# Altium footprint library Molex FFC - FPC Connectors (SMT).PcbLib: 638 footprints (part 36 of 40)
Each footprint in its own frame and in the unit in brackets; x right, y up, seen from the top. Pads: shape width x height; smd on the part's side, far side on the other; paste and mask are expansions set on the pad; w line width, h text height; cw(c..) or ccw(c..) is an arc to the next point about the centre after c.
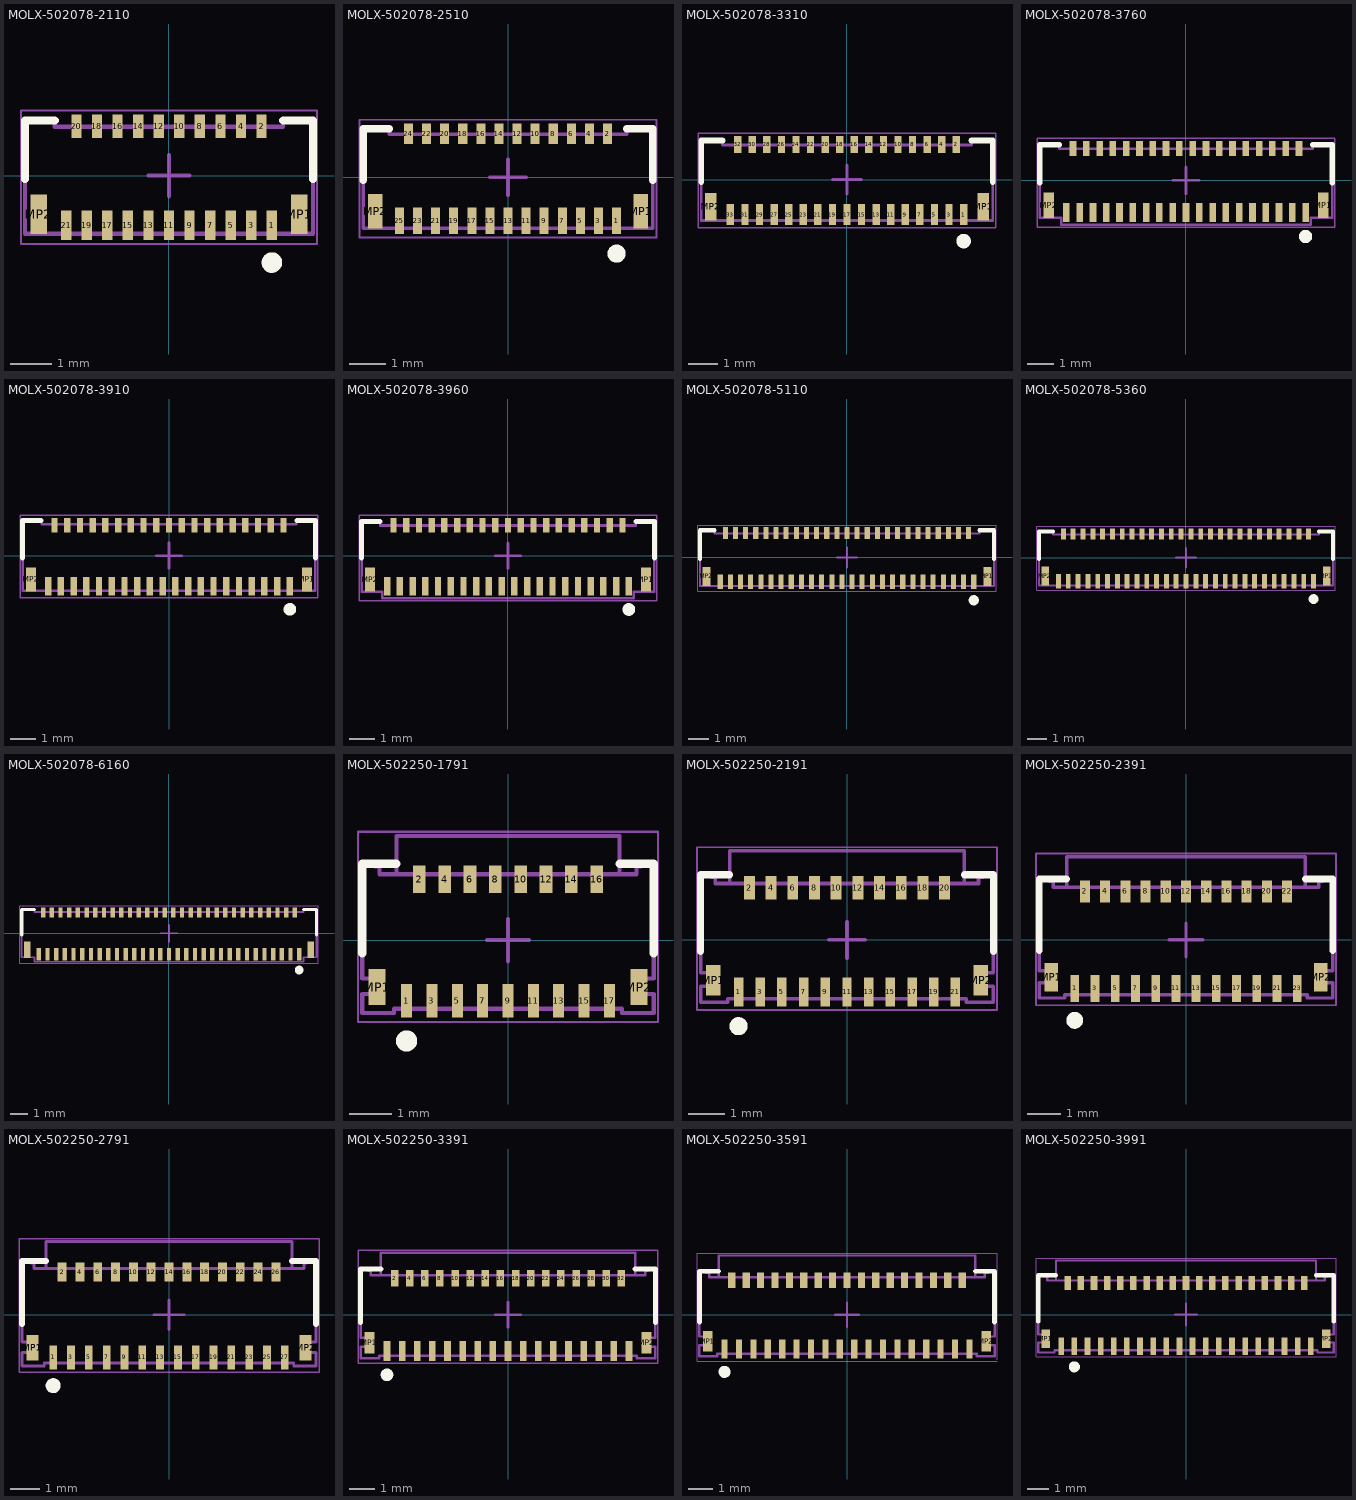
[diagram p35: the footprints below, top view; thin cyan lines are the x and y axes]

## MOLX-502078-2110 [mm] "FPC Connector, 21-Leads, Right Angle, Pitch 0.25 mm, Mated Height 1.0 mm, SMT"
height 1.012
pads (23):
  rect 0.25x0.72 smd: 1(2.5,-1.202) 3(2,-1.202) 5(1.5,-1.202) 7(1,-1.202) 9(0.5,-1.202) 11(0,-1.202) 13(-0.5,-1.202) 15(-1,-1.202) 17(-1.5,-1.202) 19(-2,-1.202) 21(-2.5,-1.202)
  rect 0.25x0.57 smd: 2(2.25,1.202) 4(1.75,1.202) 6(1.25,1.202) 8(0.75,1.202) 10(0.25,1.202) 12(-0.25,1.202) 14(-0.75,1.202) 16(-1.25,1.202) 18(-1.75,1.202) 20(-2.25,1.202)
  rect 0.4x0.95 smd: MP1(3.17,-0.937) MP2(-3.17,-0.937)
Top Overlay:
  circle w0.25: c2.5,-2.112 r0.125
  lines w0.2: -3.5,-0.084 -3.5,1.338 -2.775,1.338 ; 2.775,1.338 3.5,1.338 3.5,-0.084
Mechanical 13:
  lines w0.1: -3.5,-1.412 -3.5,1.338 -2.775,1.338 -2.775,1.188 2.775,1.188 2.775,1.338 3.5,1.338 3.5,-1.412 -3.5,-1.412
Mechanical 15:
  lines w0.05: -3.6,1.586 -3.6,-1.662 3.6,-1.662 3.6,1.587 -3.6,1.587
  lines w0.1: -0.5,0 0.5,0 ; 0,-0.5 0,0.5
3D body: height 0.25, standoff 0, extent -3.5,-1.413 3.5,1.337

## MOLX-502078-2510 [mm] "FPC Connector, 25-Leads, Right Angle, Pitch 0.25 mm, Mated Height 1.0 mm, SMT"
height 1.012
pads (27):
  rect 0.25x0.72 smd: 1(3,-1.202) 3(2.5,-1.202) 5(2,-1.202) 7(1.5,-1.202) 9(1,-1.202) 11(0.5,-1.202) 13(0,-1.202) 15(-0.5,-1.202) 17(-1,-1.202) 19(-1.5,-1.202) 21(-2,-1.202) 23(-2.5,-1.202) 25(-3,-1.202)
  rect 0.25x0.57 smd: 2(2.75,1.202) 4(2.25,1.202) 6(1.75,1.202) 8(1.25,1.202) 10(0.75,1.202) 12(0.25,1.202) 14(-0.25,1.202) 16(-0.75,1.202) 18(-1.25,1.202) 20(-1.75,1.202) 22(-2.25,1.202) 24(-2.75,1.202)
  rect 0.4x0.95 smd: MP1(3.67,-0.937) MP2(-3.67,-0.937)
Top Overlay:
  circle w0.25: c3,-2.112 r0.125
  lines w0.2: -4,-0.084 -4,1.338 -3.275,1.338 ; 3.275,1.338 4,1.338 4,-0.084
Mechanical 13:
  lines w0.1: -4,1.338 -3.275,1.338 -3.275,1.188 3.275,1.188 3.275,1.338 4,1.338 4,-1.412 -4,-1.412 -4,-1.412 -4,1.338 ; -4,1.338 -4,1.338
Mechanical 15:
  lines w0.05: -4.1,1.586 -4.1,-1.662 4.1,-1.662 4.1,1.587 -4.1,1.587
  lines w0.1: -0.5,0 0.5,0 ; 0,-0.5 0,0.5
3D body: height 0.25, standoff 0, extent -4,-1.412 4,1.338

## MOLX-502078-3310 [mm] "FPC Connector, 33-Leads, Right Angle, Pitch 0.25 mm, Mated Height 1.0 mm, SMT"
height 1.012
pads (35):
  rect 0.25x0.72 smd: 1(4,-1.202) 3(3.5,-1.202) 5(3,-1.202) 7(2.5,-1.202) 9(2,-1.202) 11(1.5,-1.202) 13(1,-1.202) 15(0.5,-1.202) 17(0,-1.202) 19(-0.5,-1.202) 21(-1,-1.202) 23(-1.5,-1.202) 25(-2,-1.202) 27(-2.5,-1.202) 29(-3,-1.202) 31(-3.5,-1.202) 33(-4,-1.202)
  rect 0.25x0.57 smd: 2(3.75,1.202) 4(3.25,1.202) 6(2.75,1.202) 8(2.25,1.202) 10(1.75,1.202) 12(1.25,1.202) 14(0.75,1.202) 16(0.25,1.202) 18(-0.25,1.202) 20(-0.75,1.202) 22(-1.25,1.202) 24(-1.75,1.202) 26(-2.25,1.202) 28(-2.75,1.202) 30(-3.25,1.202) 32(-3.75,1.202)
  rect 0.4x0.95 smd: MP1(4.67,-0.937) MP2(-4.67,-0.937)
Top Overlay:
  circle w0.25: c4,-2.112 r0.125
  lines w0.2: -5,-0.084 -5,1.338 -4.275,1.338 ; 4.275,1.338 5,1.338 5,-0.084
Mechanical 13:
  lines w0.1: -5,-1.412 -5,-1.412 ; -5,-1.412 5,-1.412 5,1.338 4.275,1.338 4.275,1.188 -4.275,1.188 -4.275,1.338 -5,1.338 ; -5,-1.412 -5,1.338 ; -5,1.338 -5,1.338
Mechanical 15:
  lines w0.05: -5.1,1.586 -5.1,-1.662 5.1,-1.662 5.1,1.587 -5.1,1.587
  lines w0.1: -0.5,0 0.5,0 ; 0,-0.5 0,0.5
3D body: height 0.25, standoff 0, extent -5,-1.412 5,1.338

## MOLX-502078-3760 [mm] "FPC Connector, 37-Leads, Right Angle, Pitch 0.25 mm, Mated Height 1.0 mm, SMT"
height 1.012
pads (39):
  rect 0.25x0.72 smd: 1(4.5,-1.202) 3(4,-1.202) 5(3.5,-1.202) 7(3,-1.202) 9(2.5,-1.202) 11(2,-1.202) 13(1.5,-1.202) 15(1,-1.202) 17(0.5,-1.202) 19(0,-1.202) 21(-0.5,-1.202) 23(-1,-1.202) 25(-1.5,-1.202) 27(-2,-1.202) 29(-2.5,-1.202) 31(-3,-1.202) 33(-3.5,-1.202) 35(-4,-1.202) 37(-4.5,-1.202)
  rect 0.25x0.57 smd: 2(4.25,1.202) 4(3.75,1.202) 6(3.25,1.202) 8(2.75,1.202) 10(2.25,1.202) 12(1.75,1.202) 14(1.25,1.202) 16(0.75,1.202) 18(0.25,1.202) 20(-0.25,1.202) 22(-0.75,1.202) 24(-1.25,1.202) 26(-1.75,1.202) 28(-2.25,1.202) 30(-2.75,1.202) 32(-3.25,1.202) 34(-3.75,1.202) 36(-4.25,1.202)
  rect 0.4x0.95 smd: MP1(5.17,-0.937) MP2(-5.17,-0.937)
Top Overlay:
  circle w0.25: c4.5,-2.112 r0.125
  lines w0.2: -5.5,-0.084 -5.5,1.338 -4.775,1.338 ; 4.775,1.338 5.5,1.338 5.5,-0.084
Mechanical 13:
  lines w0.1: -5.5,-1.412 -5.5,-1.412 ; -5.5,-1.412 -5.5,1.338 ; -5.5,-1.412 -4.701,-1.412 -4.701,-1.669 4.699,-1.669 4.699,-1.413 5.5,-1.412 5.5,1.338 4.775,1.338 4.775,1.188 -4.775,1.188 -4.775,1.338 -5.5,1.338 ; -5.5,1.338 -5.5,1.338
Mechanical 15:
  lines w0.05: -5.6,-1.77 -5.6,1.587 5.6,1.587 5.6,-1.77 -5.6,-1.77
  lines w0.1: -0.5,0 0.5,0 ; 0,-0.5 0,0.5
3D body: height 0.25, standoff 0, extent -5.5,-1.674 5.5,1.338

## MOLX-502078-3910 [mm] "FPC Connector, 39-Leads, Right Angle, Pitch 0.25 mm, Mated Height 1.0 mm, SMT"
height 1.012
pads (41):
  rect 0.25x0.72 smd paste-0.06: 1(4.75,-1.202) 3(4.25,-1.202) 5(3.75,-1.202) 7(3.25,-1.202) 9(2.75,-1.202) 11(2.25,-1.202) 13(1.75,-1.202) 15(1.25,-1.202) 17(0.75,-1.202) 19(0.25,-1.202) 21(-0.25,-1.202) 23(-0.75,-1.202) 25(-1.25,-1.202) 27(-1.75,-1.202) 29(-2.25,-1.202) 31(-2.75,-1.202) 33(-3.25,-1.202) 35(-3.75,-1.202) 37(-4.25,-1.202) 39(-4.75,-1.202)
  rect 0.25x0.57 smd paste-0.06: 2(4.5,1.203) 4(4,1.203) 6(3.5,1.203) 8(3,1.203) 10(2.5,1.203) 12(2,1.203) 14(1.5,1.203) 16(1,1.203) 18(0.5,1.203) 20(0,1.203) 22(-0.5,1.203) 24(-1,1.203) 26(-1.5,1.203) 28(-2,1.203) 30(-2.5,1.203) 32(-3,1.203) 34(-3.5,1.203) 36(-4,1.203) 38(-4.5,1.203)
  rect 0.4x0.95 smd paste-0.06: MP1(5.42,-0.937) MP2(-5.42,-0.937)
Top Overlay:
  circle w0.25: c4.75,-2.113 r0.125
  lines w0.2: -5.75,-0.084 -5.75,1.375 -5.025,1.375 ; 5.025,1.375 5.75,1.375 5.75,-0.084
Mechanical 13:
  lines w0.1: -5.75,-1.375 -5.75,1.375 -5,1.375 -5,1.225 5,1.225 5,1.375 5.75,1.375 5.75,-1.375 -5.75,-1.375
Mechanical 15:
  lines w0.05: -5.85,-1.663 -5.85,1.578 5.85,1.578 5.85,-1.663 -5.85,-1.663
  lines w0.1: -0.5,0 0.5,0 ; 0,-0.5 0,0.5
3D body: height 0.25, standoff 0, extent -5.75,-1.375 5.75,1.375

## MOLX-502078-3960 [mm] "FPC Connector, 39-Leads, Right Angle, Pitch 0.25 mm, Mated Height 1.0 mm, SMT"
height 1.012
pads (41):
  rect 0.25x0.72 smd: 1(4.75,-1.202) 3(4.25,-1.202) 5(3.75,-1.202) 7(3.25,-1.202) 9(2.75,-1.202) 11(2.25,-1.202) 13(1.75,-1.202) 15(1.25,-1.202) 17(0.75,-1.202) 19(0.25,-1.202) 21(-0.25,-1.202) 23(-0.75,-1.202) 25(-1.25,-1.202) 27(-1.75,-1.202) 29(-2.25,-1.202) 31(-2.75,-1.202) 33(-3.25,-1.202) 35(-3.75,-1.202) 37(-4.25,-1.202) 39(-4.75,-1.202)
  rect 0.25x0.57 smd: 2(4.5,1.202) 4(4,1.202) 6(3.5,1.202) 8(3,1.202) 10(2.5,1.202) 12(2,1.202) 14(1.5,1.202) 16(1,1.202) 18(0.5,1.202) 20(0,1.202) 22(-0.5,1.202) 24(-1,1.202) 26(-1.5,1.202) 28(-2,1.202) 30(-2.5,1.202) 32(-3,1.202) 34(-3.5,1.202) 36(-4,1.202) 38(-4.5,1.202)
  rect 0.4x0.95 smd: MP1(5.42,-0.937) MP2(-5.42,-0.937)
Top Overlay:
  circle w0.25: c4.75,-2.112 r0.125
  lines w0.2: -5.75,-0.084 -5.75,1.338 -5.025,1.338 ; 5.025,1.338 5.75,1.338 5.75,-0.084
Mechanical 13:
  lines w0.1: -5.75,1.338 -5.75,1.338 ; -5.75,1.338 -5.75,-1.412 -5.75,-1.412 -4.951,-1.412 -4.951,-1.669 4.949,-1.669 4.949,-1.413 5.75,-1.412 5.75,1.338 5.025,1.338 5.025,1.188 -5.025,1.188 -5.025,1.338 -5.75,1.338
Mechanical 15:
  lines w0.05: -5.85,-1.77 5.85,-1.77 5.85,1.587 -5.85,1.587 -5.85,-1.77
  lines w0.1: -0.5,0 0.5,0 ; 0,-0.5 0,0.5
3D body: height 0.25, standoff 0, extent -5.75,-1.673 5.75,1.338

## MOLX-502078-5110 [mm] "FPC Connector, 51-Leads, Right Angle, Pitch 0.25 mm, Mated Height 1.0 mm, SMT"
height 1.012
pads (53):
  rect 0.25x0.72 smd: 1(6.25,-1.202) 3(5.75,-1.202) 5(5.25,-1.202) 7(4.75,-1.202) 9(4.25,-1.202) 11(3.75,-1.202) 13(3.25,-1.202) 15(2.75,-1.202) 17(2.25,-1.202) 19(1.75,-1.202) 21(1.25,-1.202) 23(0.75,-1.202) 25(0.25,-1.202) 27(-0.25,-1.202) 29(-0.75,-1.202) 31(-1.25,-1.202) 33(-1.75,-1.202) 35(-2.25,-1.202) 37(-2.75,-1.202) 39(-3.25,-1.202) 41(-3.75,-1.202) 43(-4.25,-1.202) 45(-4.75,-1.202) 47(-5.25,-1.202) 49(-5.75,-1.202) 51(-6.25,-1.202)
  rect 0.25x0.57 smd: 2(6,1.203) 4(5.5,1.203) 6(5,1.203) 8(4.5,1.203) 10(4,1.203) 12(3.5,1.203) 14(3,1.203) 16(2.5,1.203) 18(2,1.203) 20(1.5,1.203) 22(1,1.203) 24(0.5,1.203) 26(0,1.203) 28(-0.5,1.203) 30(-1,1.203) 32(-1.5,1.203) 34(-2,1.203) 36(-2.5,1.203) 38(-3,1.203) 40(-3.5,1.203) 42(-4,1.203) 44(-4.5,1.203) 46(-5,1.203) 48(-5.5,1.203) 50(-6,1.203)
  rect 0.4x0.95 smd: MP1(6.92,-0.937) MP2(-6.92,-0.937)
Top Overlay:
  circle w0.25: c6.25,-2.112 r0.125
  lines w0.2: -7.25,-0.084 -7.25,1.338 -6.525,1.338 ; 6.525,1.338 7.25,1.338 7.25,-0.084
Mechanical 13:
  lines w0.1: -7.25,-1.412 -7.25,-1.412 ; -7.25,-1.412 -7.25,1.338 ; -7.25,-1.412 7.25,-1.412 7.25,1.338 6.525,1.338 6.525,1.188 -6.525,1.188 -6.525,1.338 -7.25,1.338 ; -7.25,1.338 -7.25,1.338
Mechanical 15:
  lines w0.05: -7.35,-1.662 -7.35,1.587 7.35,1.587 7.35,-1.662 -7.35,-1.662
  lines w0.1: -0.5,0 0.5,0 ; 0,-0.5 0,0.5
3D body: height 0.25, standoff 0, extent -7.25,-1.412 7.25,1.338

## MOLX-502078-5360 [mm] "FPC Connector, 53-Leads, Right Angle, Pitch 0.25 mm, Mated Height 1.0 mm, SMT"
height 1.012
pads (55):
  rect 0.25x0.72 smd: 1(6.5,-1.202) 3(6,-1.202) 5(5.5,-1.202) 7(5,-1.202) 9(4.5,-1.202) 11(4,-1.202) 13(3.5,-1.202) 15(3,-1.202) 17(2.5,-1.202) 19(2,-1.202) 21(1.5,-1.202) 23(1,-1.202) 25(0.5,-1.202) 27(0,-1.202) 29(-0.5,-1.202) 31(-1,-1.202) 33(-1.5,-1.202) 35(-2,-1.202) 37(-2.5,-1.202) 39(-3,-1.202) 41(-3.5,-1.202) 43(-4,-1.202) 45(-4.5,-1.202) 47(-5,-1.202) 49(-5.5,-1.202) 51(-6,-1.202) 53(-6.5,-1.202)
  rect 0.25x0.57 smd: 2(6.25,1.202) 4(5.75,1.202) 6(5.25,1.202) 8(4.75,1.202) 10(4.25,1.202) 12(3.75,1.202) 14(3.25,1.202) 16(2.75,1.202) 18(2.25,1.202) 20(1.75,1.202) 22(1.25,1.202) 24(0.75,1.202) 26(0.25,1.202) 28(-0.25,1.202) 30(-0.75,1.202) 32(-1.25,1.202) 34(-1.75,1.202) 36(-2.25,1.202) 38(-2.75,1.202) 40(-3.25,1.202) 42(-3.75,1.202) 44(-4.25,1.202) 46(-4.75,1.202) 48(-5.25,1.202) 50(-5.75,1.202) 52(-6.25,1.202)
  rect 0.4x0.95 smd: MP1(7.17,-0.937) MP2(-7.17,-0.937)
Top Overlay:
  circle w0.25: c6.5,-2.112 r0.125
  lines w0.2: -7.5,-0.084 -7.5,1.338 -6.775,1.338 ; 6.775,1.338 7.5,1.338 7.5,-0.084
Mechanical 13:
  lines w0.1: -7.5,1.338 -7.5,1.338 ; -7.5,1.338 -7.5,-1.412 -7.5,-1.412 7.5,-1.412 7.5,1.338 6.775,1.338 6.775,1.188 -6.775,1.188 -6.775,1.338 -7.5,1.338
Mechanical 15:
  lines w0.05: -7.6,-1.662 7.6,-1.662 7.6,1.587 -7.6,1.587 -7.6,-1.662
  lines w0.1: -0.5,0 0.5,0 ; 0,-0.5 0,0.5
3D body: height 1.01, standoff 0.01, extent -7.5,-1.412 7.5,1.338

## MOLX-502078-6160 [mm] "FPC Connector, 61-Leads, Right Angle, Pitch 0.25 mm, Mated Height 1.0 mm, SMT"
height 1.012
pads (63):
  rect 0.25x0.72 smd paste-0.06: 1(7.5,-1.202) 3(7,-1.202) 5(6.5,-1.202) 7(6,-1.202) 9(5.5,-1.202) 11(5,-1.202) 13(4.5,-1.202) 15(4,-1.202) 17(3.5,-1.202) 19(3,-1.202) 21(2.5,-1.202) 23(2,-1.202) 25(1.5,-1.202) 27(1,-1.202) 29(0.5,-1.202) 31(0,-1.202) 33(-0.5,-1.202) 35(-1,-1.202) 37(-1.5,-1.202) 39(-2,-1.202) 41(-2.5,-1.202) 43(-3,-1.202) 45(-3.5,-1.202) 47(-4,-1.202) 49(-4.5,-1.202) 51(-5,-1.202) 53(-5.5,-1.202) 55(-6,-1.202) 57(-6.5,-1.202) 59(-7,-1.202) 61(-7.5,-1.202)
  rect 0.25x0.57 smd paste-0.06: 2(7.25,1.203) 4(6.75,1.203) 6(6.25,1.203) 8(5.75,1.203) 10(5.25,1.203) 12(4.75,1.203) 14(4.25,1.203) 16(3.75,1.203) 18(3.25,1.203) 20(2.75,1.203) 22(2.25,1.203) 24(1.75,1.203) 26(1.25,1.203) 28(0.75,1.203) 30(0.25,1.203) 32(-0.25,1.203) 34(-0.75,1.203) 36(-1.25,1.203) 38(-1.75,1.203) 40(-2.25,1.203) 42(-2.75,1.203) 44(-3.25,1.203) 46(-3.75,1.203) 48(-4.25,1.203) 50(-4.75,1.203) 52(-5.25,1.203) 54(-5.75,1.203) 56(-6.25,1.203) 58(-6.75,1.203) 60(-7.25,1.203)
  rect 0.4x0.95 smd paste-0.06: MP1(8.17,-0.937) MP2(-8.17,-0.937)
Top Overlay:
  circle w0.25: c7.5,-2.113 r0.125
  lines w0.2: -8.5,-0.084 -8.5,1.375 -7.775,1.375 ; 7.775,1.375 8.5,1.375 8.5,-0.084
Mechanical 13:
  lines w0.1: -8.5,-1.375 -8.5,1.375 -7.75,1.375 -7.75,1.225 7.75,1.225 7.75,1.375 8.5,1.375 8.5,-1.375 7.75,-1.375 7.75,-1.636 -7.75,-1.636 -7.75,-1.375 -8.5,-1.375
Mechanical 15:
  lines w0.05: -8.6,-1.736 -8.6,1.588 8.6,1.588 8.6,-1.736 -8.6,-1.736
  lines w0.1: -0.5,0 0.5,0 ; 0,-0.5 0,0.5
3D body: height 0.25, standoff 0, extent -8.5,-1.636 8.5,1.375

## MOLX-502250-1791 [mm] "FPC Connector, 17-Leads, Right Angle, Pitch 0.3 mm, Mated Height 0.9 mm, SMT"
height 0.912
pads (19):
  rect 0.26x0.8 smd: 1(-2.4,-1.437) 3(-1.8,-1.437) 5(-1.2,-1.437) 7(-0.6,-1.437) 9(0,-1.437) 11(0.6,-1.437) 13(1.2,-1.437) 15(1.8,-1.437) 17(2.4,-1.437)
  rect 0.3x0.65 smd: 2(-2.1,1.438) 4(-1.5,1.438) 6(-0.9,1.438) 8(-0.3,1.438) 10(0.3,1.438) 12(0.9,1.438) 14(1.5,1.438) 16(2.1,1.438)
  rect 0.4x0.85 smd: MP1(-3.1,-1.112) MP2(3.1,-1.112)
Top Overlay:
  circle w0.25: c-2.4,-2.387 r0.125
  lines w0.2: -3.45,-0.317 -3.45,1.803 -2.648,1.803 ; 2.648,1.803 3.45,1.803 3.45,-0.317
Mechanical 13:
  lines w0.1: -3.15,1.803 -3.15,1.74 -3.04,1.74 -3.04,1.56 3.04,1.56 3.04,1.74 3.15,1.74 3.15,1.803 3.45,1.803 3.45,-0.912 3.17,-0.912 3.17,-1.277 3.45,-1.277 3.45,-1.727 2.7,-1.727 2.7,-1.628 -2.7,-1.628 -2.7,-1.72 ; -3.15,1.803 -3.45,1.803 -3.45,-0.912 -3.17,-0.912 -3.17,-1.277 -3.45,-1.277 -3.45,-1.727 -2.7,-1.727 ; -2.64,1.56 -2.64,2.463 2.64,2.463 2.64,1.56
Mechanical 15:
  lines w0.05: -3.55,-1.937 3.55,-1.937 3.55,2.563 -3.55,2.563 -3.55,-1.937
  lines w0.1: -0.5,0 0.5,0 ; 0,-0.5 0,0.5
3D body: height 0.25, standoff 0, extent -3.45,-1.727 3.45,2.463

## MOLX-502250-2191 [mm] "FPC Connector, 21-Leads, Right Angle, Pitch 0.3 mm, Mated Height 0.9 mm, SMT"
height 0.912
pads (23):
  rect 0.26x0.8 smd: 1(-3,-1.438) 3(-2.4,-1.438) 5(-1.8,-1.438) 7(-1.2,-1.438) 9(-0.6,-1.438) 11(0,-1.438) 13(0.6,-1.438) 15(1.2,-1.438) 17(1.8,-1.438) 19(2.4,-1.438) 21(3,-1.438)
  rect 0.3x0.65 smd: 2(-2.7,1.438) 4(-2.1,1.438) 6(-1.5,1.438) 8(-0.9,1.438) 10(-0.3,1.438) 12(0.3,1.438) 14(0.9,1.438) 16(1.5,1.438) 18(2.1,1.438) 20(2.7,1.438)
  rect 0.4x0.85 smd: MP1(-3.7,-1.112) MP2(3.7,-1.112)
Top Overlay:
  circle w0.25: c-3,-2.388 r0.125
  lines w0.2: -4.05,-0.317 -4.05,1.803 -3.248,1.803 ; 3.248,1.803 4.05,1.803 4.05,-0.317
Mechanical 13:
  lines w0.1: -3.3,-1.72 -3.3,-1.628 3.3,-1.628 3.3,-1.727 ; -3.3,-1.727 -4.05,-1.727 -4.05,-1.277 -3.77,-1.277 -3.77,-0.912 -4.05,-0.912 -4.05,1.803 -3.75,1.803 -3.75,1.74 -3.64,1.74 -3.64,1.56 3.64,1.56 3.64,1.74 3.75,1.74 3.75,1.803 ; -3.24,1.56 -3.24,2.463 3.24,2.463 3.24,1.56 ; 3.749,1.803 4.05,1.803 4.05,-0.912 3.77,-0.912 3.77,-1.277 ; 3.77,-1.277 4.05,-1.277 4.05,-1.727 3.3,-1.727 ; 3.3,-1.727 3.3,-1.727
Mechanical 15:
  lines w0.05: -4.15,-1.937 4.15,-1.937 4.15,2.563 -4.15,2.563 -4.15,-1.937
  lines w0.1: -0.5,0 0.5,0 ; 0,-0.5 0,0.5
3D body: height 0.25, standoff 0, extent -4.05,-1.727 4.05,2.463

## MOLX-502250-2391 [mm] "FPC Connector, 23-Leads, Right Angle, Pitch 0.3 mm, Mated Height 0.9 mm, SMT"
height 0.912
pads (25):
  rect 0.26x0.8 smd: 1(-3.3,-1.437) 3(-2.7,-1.437) 5(-2.1,-1.437) 7(-1.5,-1.437) 9(-0.9,-1.437) 11(-0.3,-1.437) 13(0.3,-1.437) 15(0.9,-1.437) 17(1.5,-1.437) 19(2.1,-1.437) 21(2.7,-1.437) 23(3.3,-1.437)
  rect 0.3x0.65 smd: 2(-3,1.438) 4(-2.4,1.438) 6(-1.8,1.438) 8(-1.2,1.438) 10(-0.6,1.438) 12(0,1.438) 14(0.6,1.438) 16(1.2,1.438) 18(1.8,1.438) 20(2.4,1.438) 22(3,1.438)
  rect 0.4x0.85 smd: MP1(-4,-1.112) MP2(4,-1.112)
Top Overlay:
  circle w0.25: c-3.3,-2.387 r0.125
  lines w0.2: -4.35,-0.317 -4.35,1.803 -3.548,1.803 ; 3.548,1.803 4.35,1.803 4.35,-0.317
Mechanical 13:
  lines w0.1: -3.94,1.74 -3.94,1.56 3.94,1.56 3.94,1.74 4.05,1.74 4.05,1.803 ; -3.94,1.74 -4.05,1.74 -4.05,1.803 -4.35,1.803 -4.35,-0.912 -4.07,-0.912 -4.07,-1.277 -4.35,-1.277 -4.35,-1.727 -3.6,-1.727 -3.6,-1.628 3.6,-1.628 3.6,-1.727 ; -3.54,1.56 -3.54,2.463 3.54,2.463 3.54,1.56 ; 3.6,-1.727 4.35,-1.727 4.35,-1.277 4.07,-1.277 ; 4.049,1.803 4.35,1.803 4.35,-0.912 4.07,-0.912 4.07,-1.277
Mechanical 15:
  lines w0.05: -4.45,-1.937 4.45,-1.937 4.45,2.563 -4.45,2.563 -4.45,-1.937
  lines w0.1: -0.5,0 0.5,0 ; 0,-0.5 0,0.5
3D body: height 0.25, standoff 0, extent -4.35,-1.727 4.35,2.463

## MOLX-502250-2791 [mm] "FPC Connector, 27-Leads, Right Angle, Pitch 0.3 mm, Mated Height 0.9 mm, SMT"
height 0.912
pads (29):
  rect 0.26x0.8 smd: 1(-3.9,-1.437) 3(-3.3,-1.437) 5(-2.7,-1.437) 7(-2.1,-1.437) 9(-1.5,-1.437) 11(-0.9,-1.437) 13(-0.3,-1.437) 15(0.3,-1.437) 17(0.9,-1.437) 19(1.5,-1.437) 21(2.1,-1.437) 23(2.7,-1.437) 25(3.3,-1.437) 27(3.9,-1.437)
  rect 0.3x0.65 smd: 2(-3.6,1.438) 4(-3,1.438) 6(-2.4,1.438) 8(-1.8,1.438) 10(-1.2,1.438) 12(-0.6,1.438) 14(0,1.438) 16(0.6,1.438) 18(1.2,1.438) 20(1.8,1.438) 22(2.4,1.438) 24(3,1.438) 26(3.6,1.438)
  rect 0.4x0.85 smd: MP1(-4.6,-1.112) MP2(4.6,-1.112)
Top Overlay:
  circle w0.25: c-3.9,-2.387 r0.125
  lines w0.2: -4.95,-0.317 -4.95,1.803 -4.148,1.803 ; 4.148,1.803 4.95,1.803 4.95,-0.317
Mechanical 13:
  lines w0.1: -4.65,1.803 -4.65,1.74 -4.54,1.74 -4.54,1.56 4.54,1.56 4.54,1.74 ; -4.65,1.803 -4.95,1.803 -4.95,-0.912 -4.67,-0.912 -4.67,-1.277 -4.95,-1.277 -4.95,-1.727 -4.2,-1.727 -4.2,-1.628 4.2,-1.628 4.2,-1.727 4.95,-1.727 4.95,-1.277 ; -4.14,1.56 -4.14,2.463 4.14,2.463 4.14,1.56 ; 4.539,1.74 4.65,1.74 4.65,1.803 4.95,1.803 4.95,-0.912 4.67,-0.912 4.67,-1.277 4.95,-1.277
Mechanical 15:
  lines w0.05: -5.05,-1.937 5.05,-1.937 5.05,2.563 -5.05,2.563 -5.05,-1.937
  lines w0.1: -0.5,0 0.5,0 ; 0,-0.5 0,0.5
3D body: height 0.25, standoff 0, extent -4.95,-1.72 4.95,2.47

## MOLX-502250-3391 [mm] "FPC Connector, 33-Leads, Right Angle, Pitch 0.3 mm, Mated Height 0.9 mm, SMT"
height 0.912
pads (35):
  rect 0.26x0.8 smd: 1(-4.8,-1.438) 3(-4.2,-1.438) 5(-3.6,-1.438) 7(-3,-1.438) 9(-2.4,-1.438) 11(-1.8,-1.438) 13(-1.2,-1.438) 15(-0.6,-1.438) 17(0,-1.438) 19(0.6,-1.438) 21(1.2,-1.438) 23(1.8,-1.438) 25(2.4,-1.438) 27(3,-1.438) 29(3.6,-1.438) 31(4.2,-1.438) 33(4.8,-1.438)
  rect 0.3x0.65 smd: 2(-4.5,1.438) 4(-3.9,1.438) 6(-3.3,1.438) 8(-2.7,1.438) 10(-2.1,1.438) 12(-1.5,1.438) 14(-0.9,1.438) 16(-0.3,1.438) 18(0.3,1.438) 20(0.9,1.438) 22(1.5,1.438) 24(2.1,1.438) 26(2.7,1.438) 28(3.3,1.438) 30(3.9,1.438) 32(4.5,1.438)
  rect 0.4x0.85 smd: MP1(-5.5,-1.112) MP2(5.5,-1.112)
Top Overlay:
  circle w0.25: c-4.8,-2.388 r0.125
  lines w0.2: -5.85,-0.317 -5.85,1.803 -5.048,1.803 ; 5.048,1.803 5.85,1.803 5.85,-0.317
Mechanical 13:
  lines w0.1: -5.04,1.803 -5.04,2.463 ; -5.04,1.56 -5.04,2.463 5.04,2.463 5.04,1.803 ; -4.2,-1.627 4.2,-1.627 ; 5.04,2.463 5.04,1.56 ; 5.04,1.56 -5.44,1.56 -5.44,1.74 -5.55,1.74 -5.55,1.803 -5.85,1.803 -5.85,-0.912 -5.57,-0.912 -5.57,-1.277 -5.85,-1.277 -5.85,-1.727 -5.1,-1.727 -5.1,-1.627 5.1,-1.627 5.1,-1.727 5.85,-1.727 5.85,-1.277 5.57,-1.277 5.57,-0.912 5.85,-0.912 5.85,1.803 5.55,1.803 5.55,1.74 5.44,1.74 5.44,1.56 5.04,1.56
Mechanical 15:
  lines w0.05: -5.95,-1.937 5.95,-1.937 5.95,2.563 -5.95,2.563 -5.95,-1.937
  lines w0.1: -0.5,0 0.5,0 ; 0,-0.5 0,0.5
3D body: height 0.25, standoff 0, extent -5.85,-1.727 5.85,2.463

## MOLX-502250-3591 [mm] "FPC Connector, 35-Leads, Right Angle, Pitch 0.3 mm, Mated Height 0.9 mm, SMT"
height 0.912
pads (37):
  rect 0.26x0.8 smd: 1(-5.1,-1.437) 3(-4.5,-1.437) 5(-3.9,-1.437) 7(-3.3,-1.437) 9(-2.7,-1.437) 11(-2.1,-1.437) 13(-1.5,-1.437) 15(-0.9,-1.437) 17(-0.3,-1.437) 19(0.3,-1.437) 21(0.9,-1.437) 23(1.5,-1.437) 25(2.1,-1.437) 27(2.7,-1.437) 29(3.3,-1.437) 31(3.9,-1.437) 33(4.5,-1.437) 35(5.1,-1.437)
  rect 0.3x0.65 smd: 2(-4.8,1.438) 4(-4.2,1.438) 6(-3.6,1.438) 8(-3,1.438) 10(-2.4,1.438) 12(-1.8,1.438) 14(-1.2,1.438) 16(-0.6,1.438) 18(0,1.438) 20(0.6,1.438) 22(1.2,1.438) 24(1.8,1.438) 26(2.4,1.438) 28(3,1.438) 30(3.6,1.438) 32(4.2,1.438) 34(4.8,1.438)
  rect 0.4x0.85 smd: MP1(-5.8,-1.112) MP2(5.8,-1.112)
Top Overlay:
  circle w0.25: c-5.1,-2.387 r0.125
  lines w0.2: -6.15,-0.317 -6.15,1.803 -5.348,1.803 ; 5.348,1.803 6.15,1.803 6.15,-0.317
Mechanical 13:
  lines w0.1: -5.85,1.803 -5.85,1.74 -5.74,1.74 -5.74,1.56 5.34,1.56 ; -5.85,1.803 -6.15,1.803 -6.15,-0.912 -5.87,-0.912 -5.87,-1.277 -6.15,-1.277 -6.15,-1.727 -5.4,-1.727 -5.4,-1.627 5.4,-1.627 5.4,-1.727 6.15,-1.727 6.15,-1.277 5.87,-1.277 5.87,-0.912 ; -5.34,1.56 -5.34,2.463 ; -5.34,1.803 -5.34,2.463 ; -4.2,-1.627 4.2,-1.627 ; 5.92,-0.912 6.15,-0.912 6.15,1.803 ; 6.149,1.803 5.849,1.803 5.849,1.74 5.739,1.74 5.739,1.56 5.34,1.56 ; -5.34,2.463 5.34,2.463 5.34,1.56
Mechanical 15:
  lines w0.05: 6.25,-1.937 -6.25,-1.937 -6.25,2.563 6.25,2.563 6.25,-1.887
  lines w0.1: -0.5,0 0.5,0 ; 0,-0.5 0,0.5
3D body: height 0.25, standoff 0, extent -6.15,-1.727 6.15,2.463

## MOLX-502250-3991 [mm] "FPC Connector, 39-Leads, Right Angle, Pitch 0.3 mm, Mated Height 0.9 mm, SMT"
height 0.912
pads (41):
  rect 0.26x0.8 smd: 1(-5.7,-1.438) 3(-5.1,-1.438) 5(-4.5,-1.438) 7(-3.9,-1.438) 9(-3.3,-1.438) 11(-2.7,-1.438) 13(-2.1,-1.438) 15(-1.5,-1.438) 17(-0.9,-1.438) 19(-0.3,-1.438) 21(0.3,-1.438) 23(0.9,-1.438) 25(1.5,-1.438) 27(2.1,-1.438) 29(2.7,-1.438) 31(3.3,-1.438) 33(3.9,-1.438) 35(4.5,-1.438) 37(5.1,-1.438) 39(5.7,-1.438)
  rect 0.3x0.65 smd: 2(-5.4,1.438) 4(-4.8,1.438) 6(-4.2,1.438) 8(-3.6,1.438) 10(-3,1.438) 12(-2.4,1.438) 14(-1.8,1.438) 16(-1.2,1.438) 18(-0.6,1.438) 20(0,1.438) 22(0.6,1.438) 24(1.2,1.438) 26(1.8,1.438) 28(2.4,1.438) 30(3,1.438) 32(3.6,1.438) 34(4.2,1.438) 36(4.8,1.438) 38(5.4,1.438)
  rect 0.4x0.85 smd: MP1(-6.4,-1.112) MP2(6.4,-1.112)
Top Overlay:
  circle w0.25: c-5.1,-2.388 r0.125
  lines w0.2: -6.75,-0.317 -6.75,1.803 -5.948,1.803 ; 5.948,1.803 6.75,1.803 6.75,-0.317
Mechanical 13:
  lines w0.1: -5.94,1.56 -5.94,2.463 ; -5.94,1.803 -5.94,2.463 ; -4.2,-1.627 4.2,-1.627 ; 6.449,1.803 6.75,1.803 6.75,-0.912 6.47,-0.912 ; 6.45,1.803 6.45,1.74 6.339,1.74 6.34,1.56 5.94,1.56 ; 6.475,-0.912 6.47,-0.912 ; -5.94,2.463 5.94,2.463 5.94,1.56 ; 5.94,1.56 -6.34,1.56 -6.34,1.74 -6.45,1.74 -6.45,1.803 -6.75,1.803 -6.75,-0.912 -6.47,-0.912 -6.47,-1.277 -6.75,-1.277 -6.75,-1.727 -6,-1.727 -6,-1.627 6,-1.627 6,-1.727 6.75,-1.727 6.75,-1.277 6.47,-1.277 6.47,-0.912
Mechanical 15:
  lines w0.05: -6.85,-1.937 6.85,-1.937 6.85,2.563 -6.85,2.563 -6.85,-1.937
  lines w0.1: -0.5,0 0.5,0 ; 0,-0.5 0,0.5
3D body: height 0.25, standoff 0, extent -6.75,-1.727 6.75,2.463